# Altium schematic symbol library LimeMicroAltiumLib.SchLib: 588 symbols (part 8 of 13) (continued)
## HDMI_AMPHENOL_10029449-111RLF
designator J?, comment HDMI
Manufacturer: Amphenol FCI; Manufacturer Part Number 1: 10029449-111RLF; Part Description: HDMI HDMI™ 1.4 Receptacle Connector 19 Position Surface Mount, Right Angle; Through Hole; Body Material: Stainless Steel; Gender: Receptacle; Voltage Rating: 40V; Number of Contacts: 19; Insulation Resistance: 100MR; Number of Ports: 1; Pitch: 0.5mm; Supplier 1: Mouser; Stock 1: 4435; Pricing 1: 1=0.72, 10=0.661, 50=0.525, 100=0.503, 1000=0.367, 10000=0.325 (USD); Mount: Horizontal,Surface Mount; Contact Material: Bronze,Copper Alloy; Contact Plating: Gold; Colour: Black; Number of Terminals: 19; Housing Material: Thermoplastic; Min Operating Temperature: -55°C; Max Operating Temperature: 85°C; Package Quantity: 400; Packaging: Tape and Reel; Connector Type: HDMI; Number of Positions: 19; Termination: Solder; Max Voltage Rating (AC): 40V; Orientation: Right Angle; Features: Shielded; Length: 15.7mm; Depth: 9.5mm; Radiation Hardening: No; REACH SVHC: No SVHC; Lead Free: Lead Free; Supplier Part Number 1: 649-10029449-111RLF
footprint HDMI_AMPHENOL_10029449-111RLF
pins: 1 TMDS Data 2+, 2 TMDS Data 2 Shield, 3 TMDS Data 2-, 4 TMDS Data 1+, 5 TMDS Data 1 Shield, 6 TMDS Data 1-, 7 TMDS Data 0+, 8 TMDS Data 0 Shield, 9 TMDS Data 0-, 10 TMDS Clock+, 11 TMDS Clock Shield, 12 TMDS Clock-, 13 CEC, 14 Reserved/HEC Data-, 15 SCL, 16 SDA, 17 DCC/HEC/CEC Ground, 18 +5V Power, 19 Hot Plug Detect/ HEC Data+, 20 SHIELD

## HDMI_HD01-19-RA-TH
designator J?, comment HDMI
Manufacturer: CUI Devices; Manufacturer Part Number 1: HD01-19-RA-TH; Part Description: HDMI HDMI 2.1 Receptacle Connector 19 Position Through Hole, Right Angle; Supplier 1: Digi-Key; Supplier Part Number 1: 2223-HD01-19-RA-TH-ND; Stock 1: 2182; Pricing 1: 1=2,15000, 10=1,87000, 25=1,79080, 70=1,75100, 140=1,67136, 280=1,51221, 490=1,39282, 980=1,19385, 2450=1,11426 (USD); RoHS: No
footprint HDMI_HD01-19-RA-TH
pins: 1 TMDS_DATA_2+ (io), 2 TMDS_DATA_2_SHIELD, 3 TMDS_DATA_2- (io), 4 TMDS_DATA_1+ (io), 5 TMDS_DATA_1_SHIELD, 6 TMDS_DATA_1- (io), 7 TMDS_DATA_0+ (io), 8 TMDS_DATA_0_SHIELD, 9 TMDS_DATA_0- (io), 10 TMDS_CLOCK+ (io), 11 TMDS_CLOCK_SHIELD, 12 TMDS_CLOCK- (io), 13 CEC (io), 15 DDC_CLOCK (io), 16 DDC_DATA (io), 17 GND (power), 18 +5V_POWER (power), 19 HOT_PLUG_DETECT (in), S1 SHIELD, S2 SHIELD, S3 SHIELD, S4 SHIELD

## Header3P
designator J?, comment Header 3x1 pin  (value not drawn)
Header, 3-pin
footprint hdr1x3 (Connector; Header; 3 Position)
pins: 1, 2, 3

## Header4P
designator J?, comment Programmer  (value not drawn)
Header, 4-pin
footprint HEADER4X1_TH
pins: 1, 2, 3, 4

## Header5P
designator J?, comment Programmer  (value not drawn)
Header, 5-pin
footprint Header5x1_TH
pins: 1, 2, 3, 4, 5

## Header6P
designator J?, comment Programmer
Header, 6-pin
footprint HDR1X6 (Connector; Header; 6 Position)
pins: 1, 2, 3, 4, 5, 6

## Header7P
designator J?, comment Programmer
Header, 7-pin; Manufacturer: Sullins Connector Solutions; Manufacturer Part Number 1: PEC07SAAN; Part Description: 7 Positions Header, Unshrouded, Breakaway Connector 0.100" (2.54mm) Through Hole Tin; Number of Positions Loaded: All; Pitch: 0.100" (2.54mm); Number of Positions: 7; Connector Type: Header, Unshrouded, Breakaway; Supplier 1: Digi-Key; Color: Black; Packaging: Bulk; Category: Connectors, Interconnects; Contact Finish: Tin; Number of Rows: 1; RoHS: RoHS Compliant; Contact Type: Male Pin; Mounting Type: Through Hole; Features: -; Contact Mating Length: 0.230" (5.84mm); Termination: Solder; Fastening Type: -; Contact Finish Thickness: 100µin (2.54µm); Row Spacing: -; Supplier Part Number 1: S1012E-07-ND
footprint Header7x1_TH
pins: 1, 2, 3, 4, 5, 6, 7

## Header 2X1 LOCK
designator J?, comment Header 2X1
footprint Header1x2_TH_LOCKING
pins: 1, 2

## Header 2X2
designator J?
Header, 2-Pin, Dual row
footprint Header2x2_TH
pins: 1, 2, 3, 4

## Header 2X2_SM
designator J?
Header, 2-Pin, Dual row
footprint Header2x2_SM
pins: 1, 2, 3, 4

## Header 3X1 LOCK
designator J?, comment Header 3X1
footprint Header1x3_TH_LOCKING
pins: 1, 2, 3

## Header 3X2
designator J?
Header, 2-Pin, Dual row
footprint Header3x2
pins: 1, 2, 3, 4, 5, 6

## Header 4X1 LOCK
designator J?, comment Header 4X1
footprint Header1x4_TH_LOCKING
pins: 1, 2, 3, 4

## Header 4X2
designator J?
Header, 4-Pin, Dual row
footprint Header4x2_SM
pins: 1, 2, 3, 4, 5, 6, 7, 8

## Header 5X1 LOCK
designator J?, comment Header 5X1
footprint Header1x5_TH_LOCKING
pins: 1, 2, 3, 4, 5

## Header 5X2
designator J?
Header, 5-Pin, Dual row
footprint Header5x2_SM
pins: 1, 2, 3, 4, 5, 6, 7, 8, 9, 10

## Header 5X2_SWD
designator J?, comment SWD connector
Header, 5-Pin, Dual row; Manufacturer Part Number 1: M50-3600542; Manufacturer: Harwin Inc; Number of Positions: 10; Molding Height Above Board: 0.039" (1.00mm); Row Spacing: 0.050" (1.27mm); Number of Positions Loaded: All; Connector Type: Unshrouded; Supplier 1: Digi-Key; Contact Mating Length: 0.118" (3.00mm); Category: Connectors, Interconnects; Color: Black; RoHS: RoHS Compliant; Number of Rows: 2; Contact Finish Thickness: 3µin (0.08µm); Height Stacking (Mating): -; Contact Finish: Gold; Termination: Solder; Mounting Type: Surface Mount; Pitch: 0.050" (1.27mm); Features: -; Packaging: Bulk; Supplier Part Number 1: 952-1389-ND
footprint SWD_10_pin
pins: 1, 2, 3, 4, 5, 6, 7, 8, 9, 10

## Header 6X1 LOCK
designator J?, comment Header 6X1
footprint Header1x6_TH_LOCKING
pins: 1, 2, 3, 4, 5, 6

## Header 6X2
designator J?
Header, 8-Pin, Dual row
footprint Header6x2_SM
pins: 1, 2, 3, 4, 5, 6, 7, 8, 9, 10, 11, 12

## Header 7X2
designator J?
Header, 7-Pin, Dual row; Part Description: *
footprint Header7x2_TH (JTAG)
pins: 1, 2, 3, 4, 5, 6, 7, 8, 9, 10, 11, 12, 13, 14

## Header 8X2
designator J?
Header, 8-Pin, Dual row; LatestRevisionDate: 17-Jul-2002; LatestRevisionNote: Re-released for DXP Platform.; Publisher: Altium Limited
pins: 1, 2, 3, 4, 5, 6, 7, 8, 9, 10, 11, 12, 13, 14, 15, 16

## Header 10X2
designator J?
Header, 10-Pin, Dual row
pins: 1, 2, 3, 4, 5, 6, 7, 8, 9, 10, 11, 12, 13, 14, 15, 16, 17, 18, 19, 20

## Header 10x2_SM
designator J?
Manufacturer: Amphenol FCI; Manufacturer Part Number 1: 20021121-00020C4LF; Part Description: 20 Positions Header Connector 0.050" (1.27mm) Surface Mount Gold; Pitch - Mating: 0.050" (1.27mm); Style: Board to Board; Shrouding: Unshrouded; Number of Positions: 20; Number of Positions Loaded: All; Contact Length - Mating: 0.120" (3.05mm); Material Flammability Rating: UL94 V-0; Supplier 1: Digi-Key; RoHS: RoHS Compliant; Category: Connectors, Interconnects; Stock 1: 7468; Pricing 1: 1=1.49, 10=1.351, 100=1.1582 (USD); Packaging: Cut Tape (CT); Part Status: Active; Connector Type: Header; Contact Type: Male Pin; Number of Rows: 2; Row Spacing - Mating: 0.050" (1.27mm); Mounting Type: Surface Mount; Termination: Solder; Fastening Type: Push-Pull; Contact Length - Post: -; Overall Contact Length: -; Insulation Height: -; Contact Shape: Square; Contact Finish - Mating: Gold; Contact Finish Thickness - Mating: 10µin (0.25µm); Contact Finish - Post: Tin; Contact Material: Copper Alloy; Insulation Material: Thermoplastic; Features: Pick and Place; Operating Temperature: -; Ingress Protection: -; Insulation Color: Black; Current Rating: -; Voltage Rating: -; Mated Stacking Heights: -; Contact Finish Thickness - Post: 50µin (1.27µm); Applications: -; ComponentLink1URL: http://portal.fciconnect.com/Comergent//fci/drawing/20021121.pdf; ComponentLink1Description: http://portal.fciconnect.com/Comergent//fci/drawing/20021121.pdf; Supplier Part Number 1: 609-3698-1-ND
footprint Header10x2_SM_v2
pins: 1, 2, 3, 4, 5, 6, 7, 8, 9, 10, 11, 12, 13, 14, 15, 16, 17, 18, 19, 20

## Header 20x2_TH
designator J?
Manufacturer: Amphenol FCI; Manufacturer Part Number: 67996-140HLF; Part Description: Connector Header Through Hole 40 position 0.100" (2.54mm); Current Rating: 3A; Voltage Rating: 1.5kV; Number of Positions: 40; Insulation Resistance: 5GR; Gender: Male; Connector Type: Male Pin; Pitch: 2.54mm; Row Spacing: 0.1inch; Mating Post Length: 5.84mm; Supplier 1: Mouser; Stock 1: 136; Pricing 1: 1=1.48, 10=1.22, 50=1.22, 100=1.15, 1000=0.824, 10000=0.714 (USD); Mount: Through Hole; Contact Plating: Gold,GXT; Contact Material: Bronze; Colour: Black; Housing Colour: Black; Housing Material: Thermoplastic; Min Operating Temperature: -65°C; Max Operating Temperature: 125°C; Number of Rows: 2; Contact Gender: Male; Packaging: Bulk; Package Quantity: 200; Termination: Solder; Number of Contacts: 40; Max Voltage Rating (AC): 1.5kV; Orientation: Straight; Length: 50.8mm; Contact Mating Length: 0.23inch; Termination Post Length: 2.41mm; Depth: 4.83mm; Radiation Hardening: No; Flammability Rating: UL94 V-0; Supplier Part Number 1: 649-67996-140HLF
footprint Header20x2_TH (JTAG)
pins: 1, 2, 3, 4, 5, 6, 7, 8, 9, 10, 11, 12, 13, 14, 15, 16, 17, 18, 19, 20, 21, 22, 23, 24, 25, 26, 27, 28, 29, 30, 31, 32, 33, 34, 35, 36, 37, 38, 39, 40

## Header 22x2_SM
designator J?
footprint Header22x2_SM
pins: 1, 2, 3, 4, 5, 6, 7, 8, 9, 10, 11, 12, 13, 14, 15, 16, 17, 18, 19, 20, 21, 22, 23, 24, 25, 26, 27, 28, 29, 30, 31, 32, 33, 34, 35, 36, 37, 38, 39, 40, 41, 42, 43, 44

## Header_1x2_receptacle
designator MECH?, comment 2x1 pos. 0.1' header receptacle  (mechanical)
Part Description: 2 Position Rectangular Receptacle Connector IDC Gold 24 AWG; Manufacturer: Molex; Manufacturer Part Number 1: 0014562021; Contact Resistance: 15mR; Max Voltage Rating (DC): 250.25kV; Current Rating: 3A; Voltage Rating: 250V; Connector Type: Receptacle,Socket,IDC; Number of Positions: 2; Wire/Cable Type: Discrete,Ribbon; Wire/Cable Gauge: 24AWG; Pitch: 2.54mm; Glow Wire Compliant: Non-compliant; Supplier 1: Digi-Key; Supplier Part Number 1: 23-0014562021-ND; Stock 1: 5637; Pricing 1: 2=0,78000, 10=0,68600, 26=0,64577, 50=0,61880, 100=0,59180, 250=0,53800, 500=0,48420, 1000=0,43040, 2500=0,39005 (USD); RoHS: Yes; Mount: Free Hanging,Cable; Contact Plating: Gold; Contact Material: Bronze; Color: Black; Housing Color: Black; Housing Material: Polyester; Min Operating Temperature: -40°C; Max Operating Temperature: 105°C; Number of Rows: 1; Contact Gender: Female; Package Quantity: 1; Packaging: Rail/Tube; Termination: IDT; Number of Contacts: 2; Orientation: Straight; Number of Circuits: 2; Length: 5.05mm; Height: 15.2mm; Width: 2.51mm; Lead Free: Lead Free; ComponentLink1URL: https://datasheet.ciiva.com/5162/0014562021-rb-cbl-wr-trp-conn-156807-5162409.pdf?src-supplier=Mouser; ComponentLink1Description: https://datasheet.ciiva.com/5162/0014562021-rb-cbl-wr-trp-conn-156807-5162409.pdf?src-supplier=Mouser; ComponentLink2URL: https://datasheet.ciiva.com/702/014562021-sd-702522.pdf?src-supplier=Digi-Key; ComponentLink2Description: https://datasheet.ciiva.com/702/014562021-sd-702522.pdf?src-supplier=Digi-Key; ComponentLink3URL: https://datasheet.ciiva.com/30109/85530014562021-rb-cbl-wr-trp-n-30109738.pdf?src-supplier=Onlinecomponents.com; ComponentLink3Description: https://datasheet.ciiva.com/30109/85530014562021-rb-cbl-wr-trp-n-30109738.pdf?src-supplier=Onlinecomponents.com

## Header_8P_SM_side
designator J?, comment Header side
Header, 90deg angle, 2,54 pitch
footprint Header8x1_SM
pins: 1, 2, 3, 4, 5, 6, 7, 8

## HEADER_RECEPT_3-640441-2
designator J?, comment 3-640441-2  (mechanical)
Receptacle for 0.2'' 2 pin connector 640456-2; Manufacturer: AMP - TE CONNECTIVITY; Part Description: 2 Position Rectangular Receptacle Connector IDC Tin 24 AWG; Supplier 1: Digi-Key; Supplier Part Number 1: A30978-ND; Manufacturer Part Number 1: 3-640441-2; Stock 1: 17531; Pricing 1: 1=0,18000, 10=0,17300, 25=0,12880, 50=0,11040, 100=0,10670, 250=0,09204, 500=0,08834, 1000=0,07730, 2500=0,06994 (USD); RoHS: No; ComponentLink1URL: http://www.farnell.com/datasheets/2043229.pdf?src-supplier=Farnell; ComponentLink1Description: http://www.farnell.com/datasheets/2043229.pdf?src-supplier=Farnell; ComponentLink2URL: https://media.digikey.com/pdf/Data%20Sheets/Tyco%20Electonics%20AMP%20PDFs/640441_Dwg.pdf?src-supplier=Digi-Key; ComponentLink2Description: https://media.digikey.com/pdf/Data%20Sheets/Tyco%20Electonics%20AMP%20PDFs/640441_Dwg.pdf?src-supplier=Digi-Key

## HFCG-1600+
designator IC?
High Pass Filter 50Ω  1650 to 5000 MHz; Manufacturer: Mini-Circuits; Part Description: High Pass Filter 50Ω  1650 to 5000 MHz; Manufacturer Part Number 1: HFCG-1600+; Supplier 1: Mini-Circuits; Supplier Part Number 1: HFCG-1600+
footprint HFCG-1600+
pins: 1 GND, 2 GND, 3 GND, 4 RF_OUT (out), 5 GND, 6 GND, 7 GND, 8 RF_IN (in)

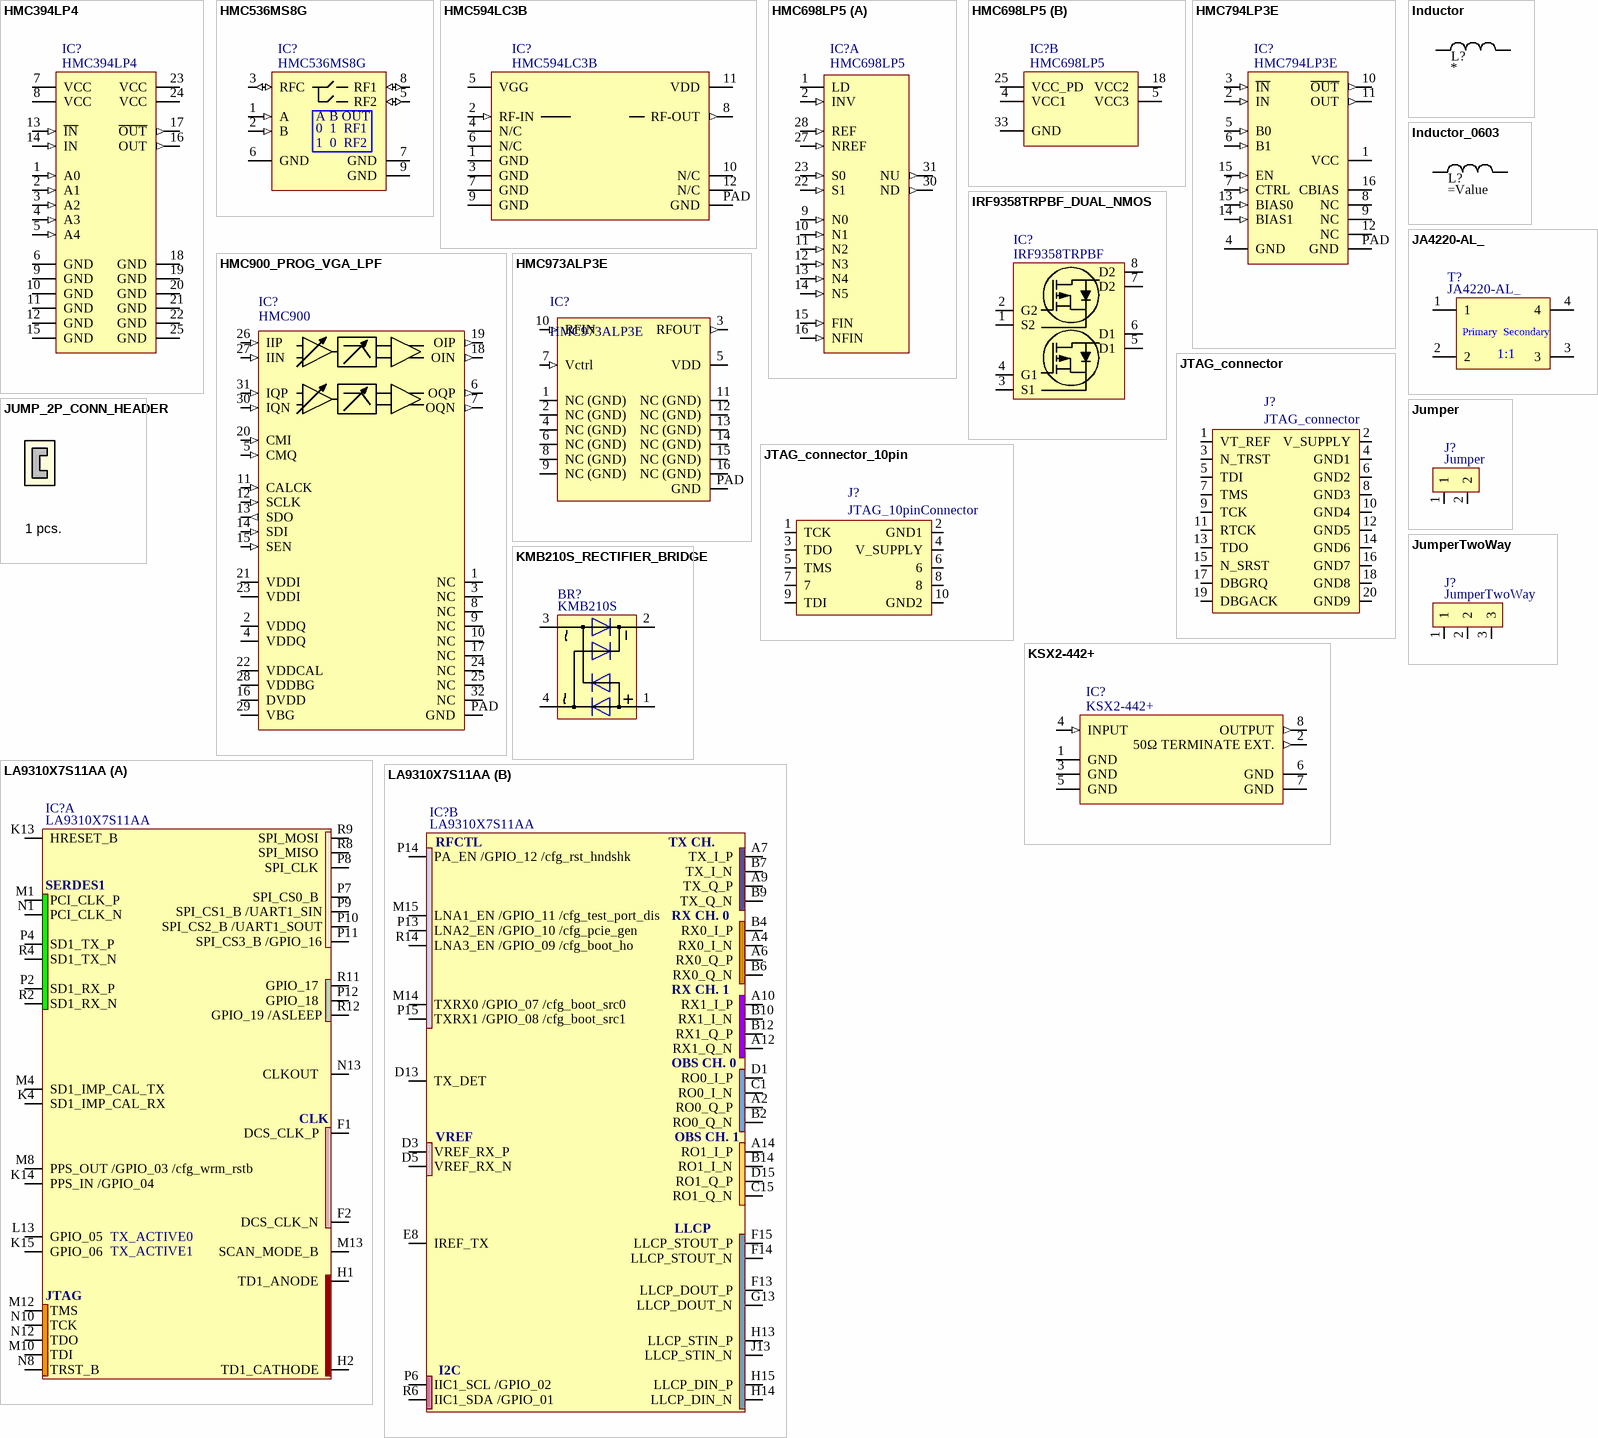
[diagram p49: symbols HMC394LP4 to LA9310X7S11AA]

## HMC394LP4
designator IC?
GaAs HBT PROGRAMMABLE 5-BIT COUNTER, DC - 2.2 GHz; Manufacturer: Analog Devices; Manufacturer Part Number 1: HMC394LP4; Part Description: GaAs HBT PROGRAMMABLE 5-BIT COUNTER, DC - 2.2 GHz; Supplier 1: Mouser; Supplier Part Number 1: 584-HMC394LP4
pins: 1 A0 (in), 2 A1 (in), 3 A2 (in), 4 A3 (in), 5 A4 (in), 6 GND, 7 VCC (power), 8 VCC (power), 9 GND, 10 GND, 11 GND, 12 GND, 13 ~{IN} (in), 14 IN (in), 15 GND, 16 OUT (out), 17 ~{OUT} (out), 18 GND, 19 GND, 20 GND, 21 GND, 22 GND, 23 VCC (power), 24 VCC (power), 25 GND

## HMC536MS8G
designator IC?
GaAs MMIC POSITIVE CONTROLT/R SWITCH, DC - 6 GHz; Manufacturer: Analog Devices; Part Description: RF Switch ICs 3 Watt SPDT T/R Switch SMT, DC - 6 GHz; Manufacturer Part Number 1: HMC536MS8G; Supplier 1: Mouser; Supplier Part Number 1: 584-HMC536MS8GE
footprint HMC536MS8G_HSOP8
pins: 1 A (in), 2 B (in), 3 RFC (io), 4 N/C hidden, 5 RF2 (io), 6 GND, 7 GND, 8 RF1 (io), 9 GND
text: A B OUT; 0  1  RF1; 1  0  RF2

## HMC594LC3B
designator IC?
GaAs PHEMT MMIC LOW NOISE AMPLIFIER, 2 - 4 GHz; Manufacturer: Analog Devices; Manufacturer Part Number 1: HMC594LC3B; Part Description: GaAs PHEMT MMIC LOW NOISE AMPLIFIER, 2 - 4 GHz; Supplier 1: Mouser; Supplier Part Number 1: 584-HMC594LC3B
footprint HMC594LC3B_QFN3x3_12 (Quad Flat No Lead, Plastic; 16 Terminals; Body 3 x 3 mm; Pitch 0.5 mm)
pins: 1 GND, 2 RF-IN (in), 3 GND, 4 N/C, 5 VGG (power), 6 N/C, 7 GND, 8 RF-OUT (out), 9 GND, 10 N/C, 11 VDD (power), 12 N/C, PAD GND

## HMC698LP5
designator IC?
7 GHz INTEGER N SYNTHESIZER; Part Description: Phase Locked Loops - PLL Synthesizer 4/5 Div w/LD INV; Manufacturer: Analog Devices; Manufacturer Part Number 1: HMC698LP5; Supplier 1: Mouser; Supplier Part Number 1: 584-HMC698LP5E
footprint HMC698LP5_QFN5X5_32 (QFN, 32-Leads, Body 5x5mm, Pitch 0.5mm, IPC High Density)
part A pins: 1 LD, 2 INV (in), 3 N/C hidden, 6 N/C hidden, 7 N/C hidden, 8 N/C hidden, 9 N0 (in), 10 N1 (in), 11 N2 (in), 12 N3 (in), 13 N4 (in), 14 N5 (in), 15 FIN (in), 16 NFIN (in), 17 N/C hidden, 19 N/C hidden, 20 N/C hidden, 21 N/C hidden, 22 S1 (in), 23 S0 (in), 24 N/C hidden, 26 N/C hidden, 27 NREF (in), 28 REF (in), 29 N/C hidden, 30 ND (out), 31 NU (out), 32 N/C hidden
part B pins: 4 VCC1 (power), 5 VCC3 (power), 18 VCC2 (power), 25 VCC_PD (power), 33 GND

## HMC794LP3E
designator IC?
2 GHz LOW NOISE PROGRAMMABLEDIVIDER (N = 1 to 4); Manufacturer: Analog Devices; Manufacturer Part Number 1: HMC794LP3E; Part Description: 2 GHz LOW NOISE PROGRAMMABLEDIVIDER (N = 1 to 4); Supplier 1: Mouser; Supplier Part Number 1: 584-HMC794LP3E
footprint HMC794LP3E_QFN3X3-16 (Quad Flat No Lead, Plastic; 16 Terminals; Body 3 x 3 mm; Pitch 0.5 mm)
pins: 1 VCC (power), 2 IN (in), 3 ~{IN} (in), 4 GND, 5 B0 (in), 6 B1 (in), 7 CTRL (in), 8 NC, 9 NC, 10 ~{OUT} (out), 11 OUT (out), 12 NC, 13 BIAS0 (in), 14 BIAS1 (in), 15 EN (in), 16 CBIAS (power), PAD GND

## HMC900_PROG_VGA_LPF
designator IC?, comment HMC900
HMC900 pin and package compatible alternative is HMC1023; Manufacturer: Analog Devices Hittite; Manufacturer Part Number 1: HMC900LP5E; Part Description: - Frequency Low Pass RF Filter (Radio Frequency) - Bandwidth - 32-VFQFN Exposed Pad; Operating Supply Voltage: 5V; Max Supply Voltage: 5.25V; Min Supply Voltage: 4.75V; Number of Channels: 2; Max Frequency: 80MHz; Bandwidth: 50MHz; Filter Type: LOW PASS FILTER; Min Frequency: 20MHz; Supplier 1: Digi-Key; Supplier Part Number 1: 1127-3123-ND; Stock 1: 78; Pricing 1: 1=35,35000, 10=32,60400, 25=31,13840, 100=28,51200 (USD); RoHS: Yes; Mount: Surface Mount; Case/Package: QFN; Number of Pins: 32; Weight: 0.006653oz; Min Operating Temperature: -40°C; Max Operating Temperature: 85°C; Type: Active; Number of Circuits: 2; Series: *; Length: 5.1mm; Width: 5.1mm; Height: 1mm; REACH SVHC: No SVHC; Package Quantity: 50; Packaging: Cut Tape
footprint HMC900_RECONFIG_VGA_LPF_QFN32 (QFN, 24-Leads, Body 4,00x4,00mm, Pitch 0,50mm, Thermal Pad 2,55x2,55mm, IPC Medium Density)
pins: 1 NC, 2 VDDQ (power), 3 NC, 4 VDDQ (power), 5 CMQ (in), 6 OQP (out), 7 OQN (out), 8 NC, 9 NC, 10 NC, 11 CALCK (in), 12 SCLK (in), 13 SDO (out), 14 SDI (in), 15 SEN (in), 16 DVDD (power), 17 NC, 18 OIN (out), 19 OIP (out), 20 CMI (in), 21 VDDI (power), 22 VDDCAL (power), 23 VDDI (power), 24 NC, 25 NC, 26 IIP (in), 27 IIN (in), 28 VDDBG (power), 29 VBG (power), 30 IQN (in), 31 IQP (in), 32 NC, PAD GND

## HMC973ALP3E
designator IC?
Part Description: RF Attenuators 28dB  500MHz ~ 6GHz 50 Ohms  16-VFQFN Exposed Pad, CSP; Manufacturer: Analog Devices Inc.; Supplier 1: Digi-Key; Supplier Part Number 1: 1127-3363-ND; Manufacturer Part Number 1: HMC973ALP3E
footprint HMC973ALP3E_QFN16_3x3
pins: 1 NC (GND), 2 NC (GND), 3 RFOUT (out), 4 NC (GND), 5 VDD (power), 6 NC (GND), 7 Vctrl (in), 8 NC (GND), 9 NC (GND), 10 RFIN (in), 11 NC (GND), 12 NC (GND), 13 NC (GND), 14 NC (GND), 15 NC (GND), 16 NC (GND), PAD GND

## Inductor
designator L?
Value: *
pins: 1, 2

## Inductor_0603
designator L?
pins: 1, 2

## IRF9358TRPBF_DUAL_NMOS
designator IC?, comment IRF9358TRPBF
Part Description: Mosfet Array 2 P-Channel (Dual) 30V 9.2A 2W Surface Mount 8-SO; Manufacturer: International Rectifier; Element Configuration: Dual; Drain to Source Breakdown Voltage: -30V; Rise Time: 7.2ns; Rds On Max: 16.3mR; Input Capacitance: 1.74nF; Nominal Vgs: -1.8V; Gate to Source Voltage (Vgs): 20V; Power Dissipation: 2W; Drain to Source Voltage (Vdss): 30V; Continuous Drain Current (ID): 9.2A; Turn-On Delay Time: 5.7ns; Turn-Off Delay Time: 146ns; Fall Time: 69ns; Drain to Source Resistance: 23.8mR; Supplier 1: Digi-Key; Supplier Part Number 1: IRF9358TRPBFDKR-ND; Manufacturer Part Number 1: IRF9358TRPBF; Stock 1: 0; RoHS: Yes; Mount: Surface Mount; Case/Package: SOIC; Number of Pins: 8; Min Operating Temperature: -55°C; Max Operating Temperature: 150°C; Package Quantity: 1; Packaging: Tape and Reel; Max Power Dissipation: 2W; Length: 5mm; Width: 4mm; Height: 1.5mm; Radiation Hardening: No; REACH SVHC: No SVHC; ComponentLink1URL: https://datasheet.ciiva.com/7798/irf9358pbf-7798959.pdf?src-supplier=Element14; ComponentLink1Description: https://datasheet.ciiva.com/7798/irf9358pbf-7798959.pdf?src-supplier=Element14; ComponentLink2URL: https://datasheet.ciiva.com/929/irf9358pbf-929243.pdf?src-supplier=Digi-Key; ComponentLink2Description: https://datasheet.ciiva.com/929/irf9358pbf-929243.pdf?src-supplier=Digi-Key; ComponentLink3URL: https://datasheet.ciiva.com/929/irf9358pbf-929244.pdf?src-supplier=Digi-Key; ComponentLink3Description: https://datasheet.ciiva.com/929/irf9358pbf-929244.pdf?src-supplier=Digi-Key; ComponentLink4URL: https://datasheet.ciiva.com/929/irf9358pbf-929245.pdf?src-supplier=Digi-Key; ComponentLink4Description: https://datasheet.ciiva.com/929/irf9358pbf-929245.pdf?src-supplier=Digi-Key
footprint IRF9358TRPBF_DUAL_NMOS_SOIC8 (8-Pin Small Outline Integrated Circuit 1.27 mm Pitch)
pins: 1 S2, 2 G2, 3 S1, 4 G1, 5 D1, 6 D1, 7 D2, 8 D2

## JA4220-AL_
designator T?
Part Description: RF balun; 1:1 ratio; 3 dB bandwidth: 0.1 MHz to 3.5 GHz; 3.8mm x 3.8mm; Supplier 1: Coilcraft; Manufacturer Part Number 1: JA4220-AL_; Supplier Part Number: JA4220-AL_
footprint JA4220-AL_
pins: 1, 2, 3, 4
text: Primary; Secondary; 1:1

## JTAG_connector
designator J?
pins: 1 VT_REF, 2 V_SUPPLY, 3 N_TRST, 4 GND1 (power), 5 TDI, 6 GND2 (power), 7 TMS, 8 GND3 (power), 9 TCK, 10 GND4 (power), 11 RTCK, 12 GND5 (power), 13 TDO, 14 GND6 (power), 15 N_SRST, 16 GND7 (power), 17 DBGRQ, 18 GND8 (power), 19 DBGACK, 20 GND9 (power)

## JTAG_connector_10pin
designator J?, comment JTAG_10pinConnector
footprint HEADER5x2_SM
pins: 1 TCK, 2 GND1 (power), 3 TDO, 4 V_SUPPLY (power), 5 TMS, 6, 7, 8, 9 TDI, 10 GND2 (power)

## JUMP_2P_CONN_HEADER
designator JMP?, comment 1 pcs.  (mechanical)
Shorting Jumper, 2-position, 2.54mm pitch; Manufacturer: Sullins Connector Solutions; Manufacturer Part Number 1: SPC02SYAN; Pitch: 0.100" (2.54mm); Gender: Female Sockets; Number of Positions or Pins (Grid): 2 (1 x 2); Supplier 1: Digi-Key; Type: Closed Top; Packaging: Bulk; Contact Finish: Gold; Color: Black; Height: 0.256" (6.50mm); RoHS: RoHS Compliant; Category: Connectors, Interconnects; Contact Finish Thickness: Flash; Supplier Part Number 1: S9001-ND
pins: 1 hidden, 2 hidden

## Jumper
designator J?
pins: 1, 2

## JumperTwoWay
designator J?
footprint HDR_1x3
pins: 1, 2, 3

## KMB210S_RECTIFIER_BRIDGE
designator BR?, comment KMB210S
Part Description: Bridge Rectifier Single Phase Schottky 100 V Surface Mount MBS; Manufacturer: SMC Diode Solutions; Manufacturer Part Number: KMB210S; Supplier Part Number 1: 1655-KMB210SCT-ND; Supplier 1: Digi-Key
footprint KMB210S_RECTIFIER_BRIDGE
pins: 1, 2, 3, 4

## KSX2-442+
designator IC?
Frequency Multiplier: 50Ω, Output 1200 to 4400 MHz; Manufacturer: Mini-Circuits; Supplier Part Number 1: KSX2-442+; Supplier 1: Mini-Circuits; Part Description: Frequency Multiplier: 50Ω, Output 1200 to 4400 MHz; Manufacturer Part Number 1: KSX2-442+
footprint KSX2-442+_HV1195
pins: 1 GND, 2 50Ω TERMINATE EXT. (out), 3 GND, 4 INPUT (in), 5 GND, 6 GND, 7 GND, 8 OUTPUT (out)

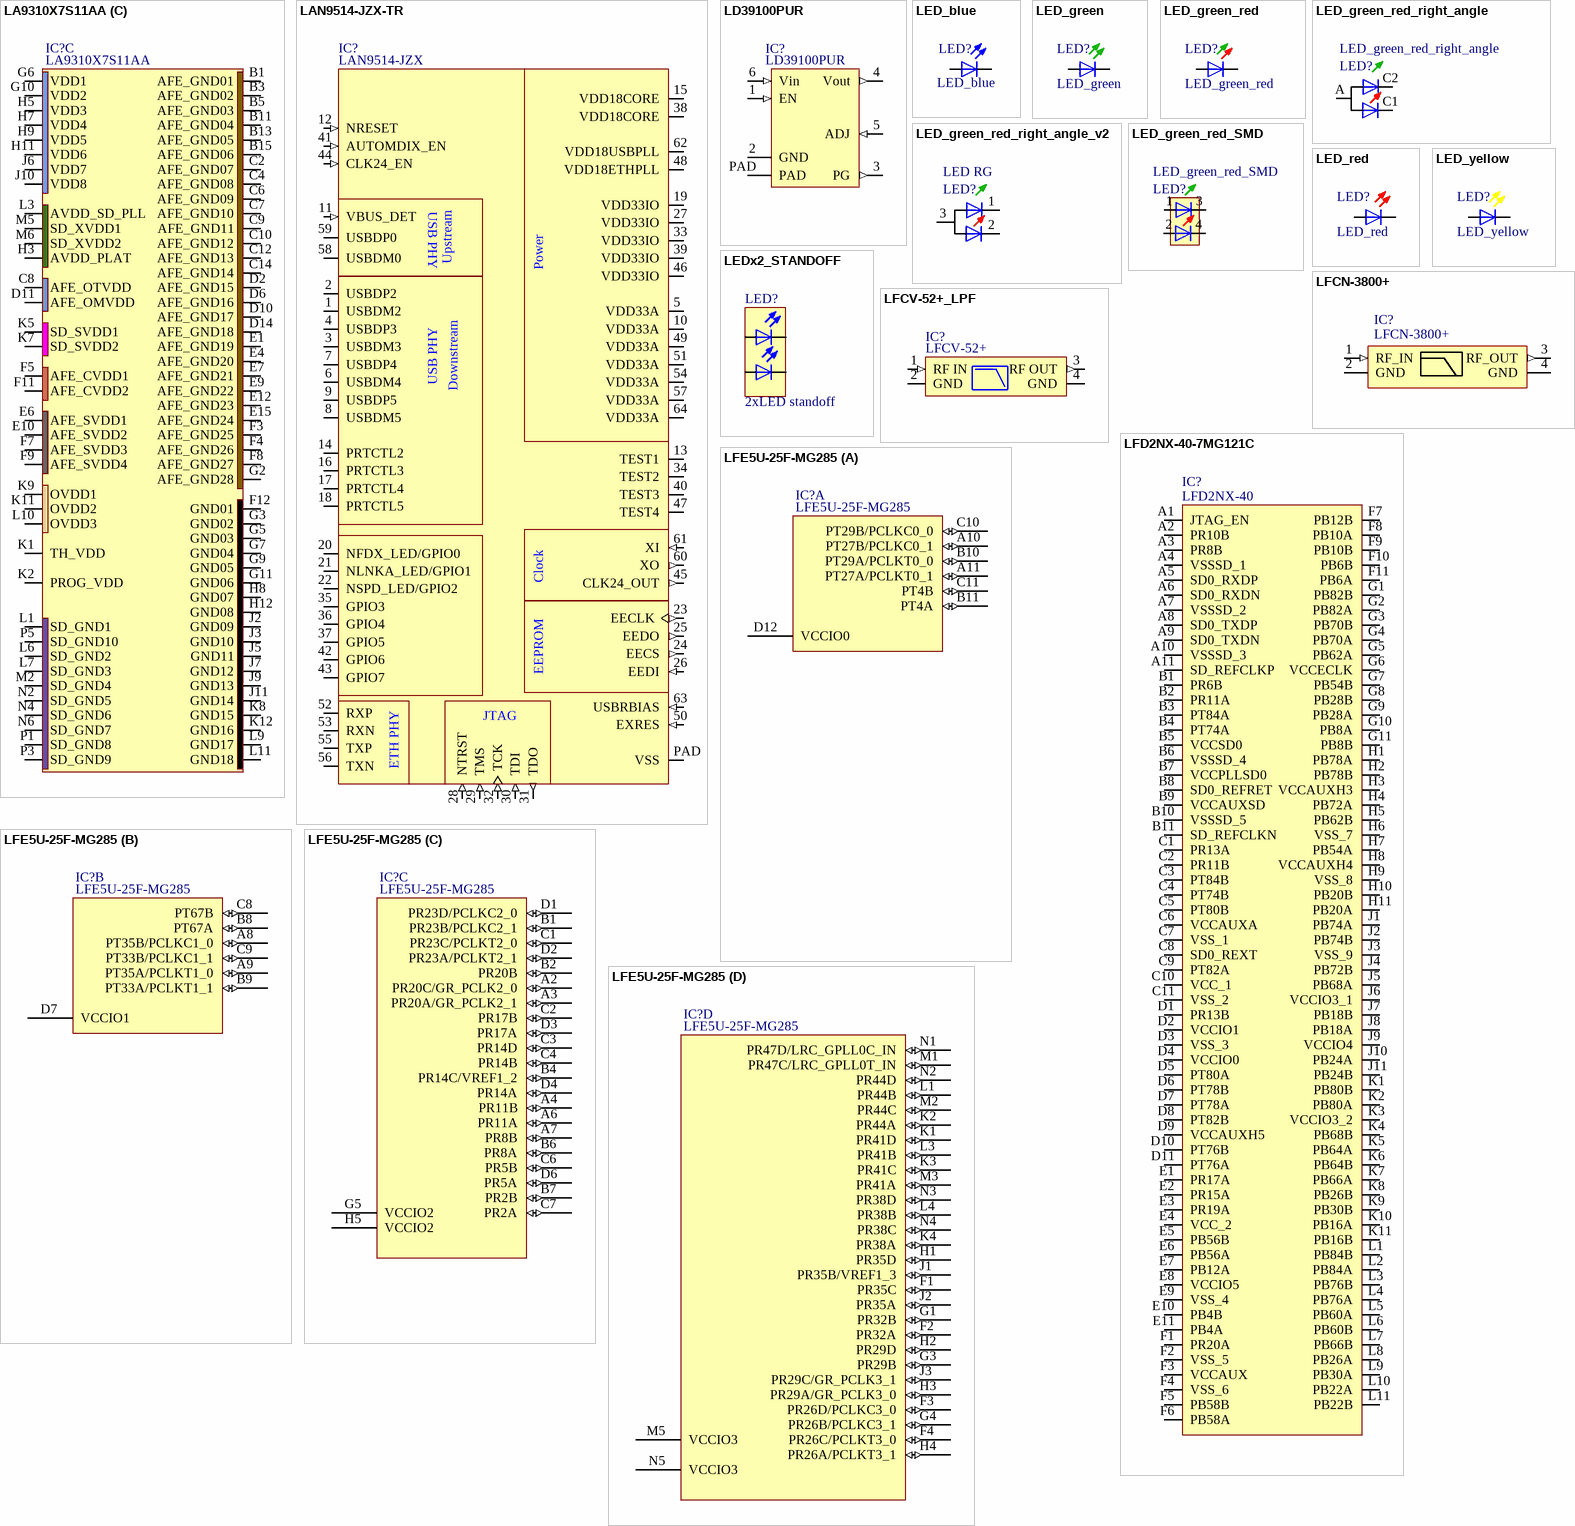
[diagram p50: symbols LA9310X7S11AA to LFE5U-25F-MG285]